# Altium footprint library User.PcbLib: 317 footprints (part 9 of 20)
Each footprint in its own frame and in the unit in brackets; x right, y up, seen from the top. Pads: shape width x height; smd on the part's side, far side on the other; paste and mask are expansions set on the pad; w line width, h text height; cw(c..) or ccw(c..) is an arc to the next point about the centre after c.
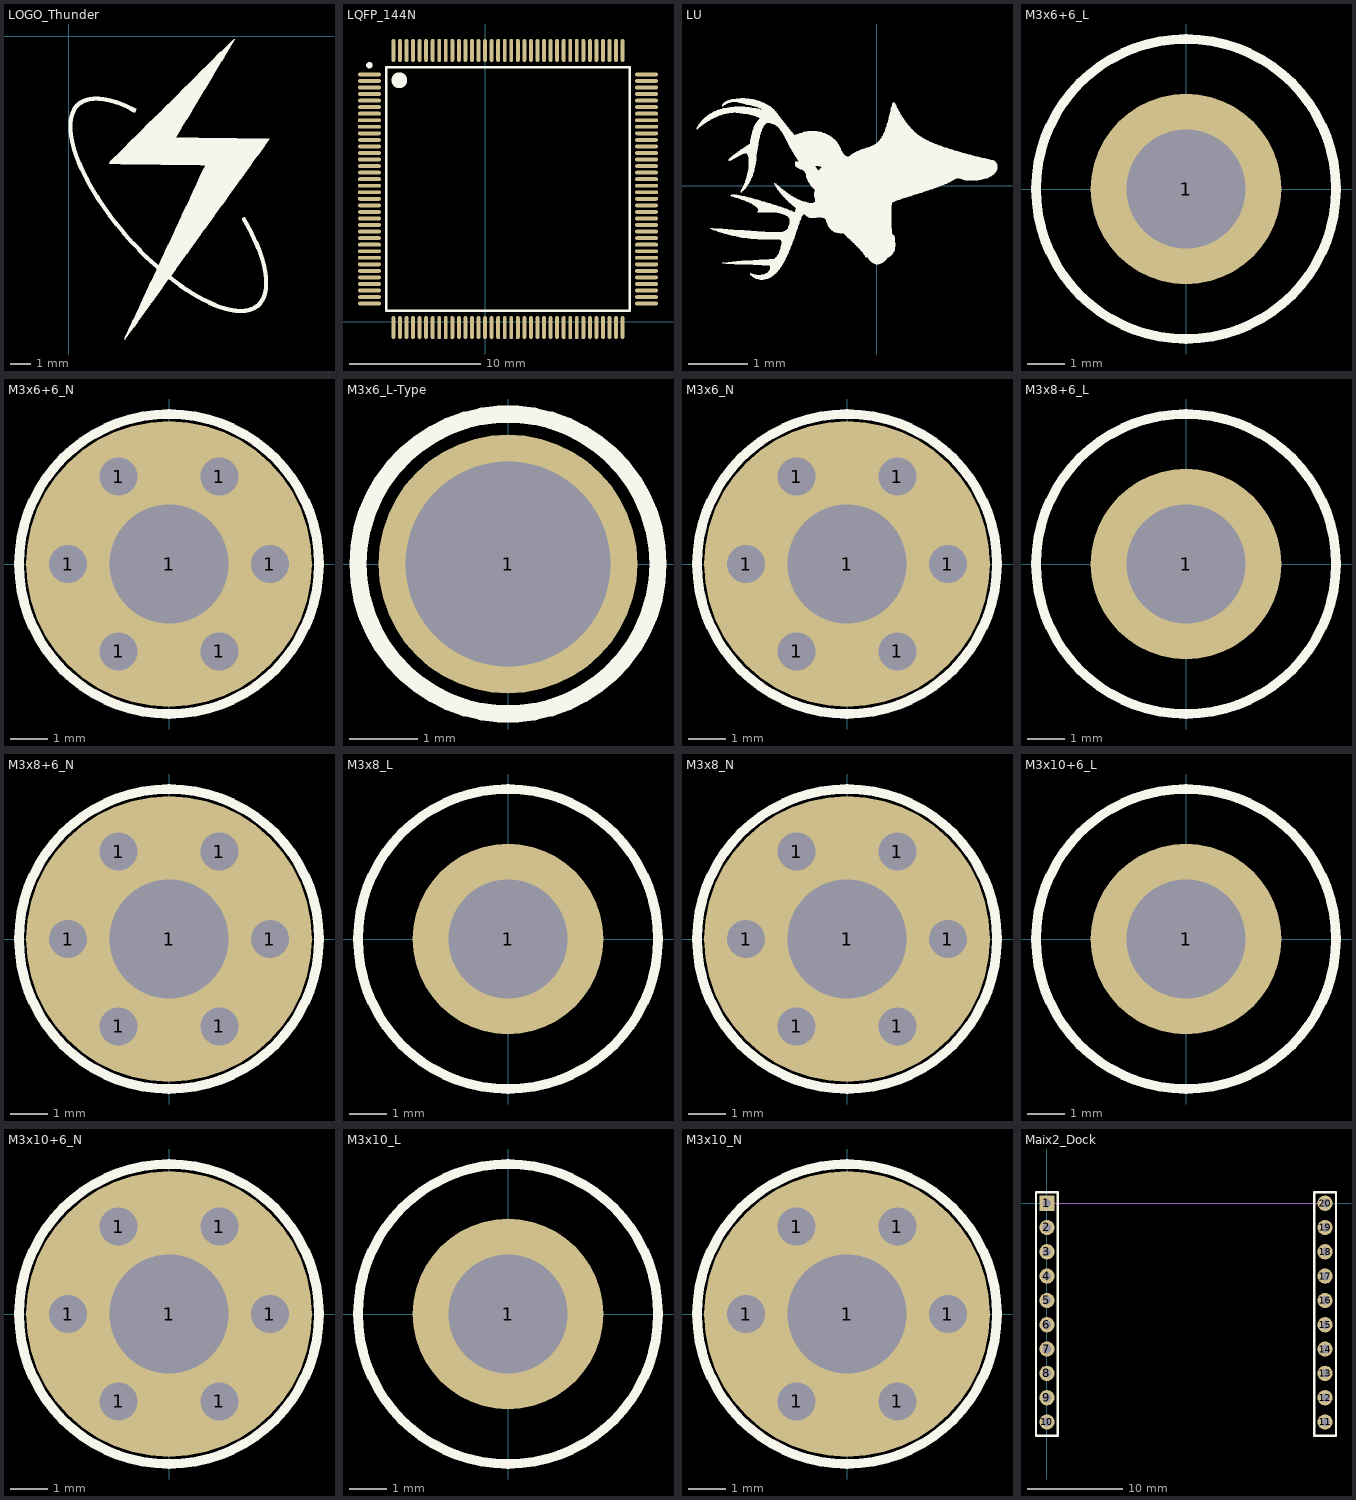
[diagram p8: the footprints below, top view; thin cyan lines are the x and y axes]

## LOGO_Thunder [mm]
Top Overlay:
  drawing of 2284 lines, arcs and shapes, not listed

## LQFP_144N [mm]
pads (144):
  oval 1.75x0.297 smd: 1(-8.82,18.868) 2(-8.82,18.368) 3(-8.82,17.868) 4(-8.82,17.368) 5(-8.82,16.868) 6(-8.82,16.368) 7(-8.82,15.868) 8(-8.82,15.368) 9(-8.82,14.868) 10(-8.82,14.368) 11(-8.82,13.868) 12(-8.82,13.368) 13(-8.82,12.868) 14(-8.82,12.368) 15(-8.82,11.868) 16(-8.82,11.368) 17(-8.82,10.868) 18(-8.82,10.368) 19(-8.82,9.868) 20(-8.82,9.368) 21(-8.82,8.868) 22(-8.82,8.368) 23(-8.82,7.868) 24(-8.82,7.368) 25(-8.82,6.868) 26(-8.82,6.368) 27(-8.82,5.868) 28(-8.82,5.368) 29(-8.82,4.868) 30(-8.82,4.368) 31(-8.82,3.868) 32(-8.82,3.368) 33(-8.82,2.868) 34(-8.82,2.368) 35(-8.82,1.868) 36(-8.82,1.368) 73(12.33,1.368) 74(12.33,1.868) 75(12.33,2.368) 76(12.33,2.868) 77(12.33,3.368) 78(12.33,3.868) 79(12.33,4.368) 80(12.33,4.868) 81(12.33,5.368) 82(12.33,5.868) 83(12.33,6.368) 84(12.33,6.868) 85(12.33,7.368) 86(12.33,7.868) 87(12.33,8.368) 88(12.33,8.868) 89(12.33,9.368) 90(12.33,9.868) 91(12.33,10.368) 92(12.33,10.868) 93(12.33,11.368) 94(12.33,11.868) 95(12.33,12.368) 96(12.33,12.868) 97(12.33,13.368) 98(12.33,13.868) 99(12.33,14.368) 100(12.33,14.868) 101(12.33,15.368) 102(12.33,15.868) 103(12.33,16.368) 104(12.33,16.868) 105(12.33,17.368) 106(12.33,17.868) 107(12.33,18.368) 108(12.33,18.868)
  oval 0.297x1.75 smd: 37(-6.995,-0.457) 38(-6.495,-0.457) 39(-5.995,-0.457) 40(-5.495,-0.457) 41(-4.995,-0.457) 42(-4.495,-0.457) 43(-3.995,-0.457) 44(-3.495,-0.457) 45(-2.995,-0.457) 46(-2.495,-0.457) 47(-1.995,-0.457) 48(-1.495,-0.457) 49(-0.995,-0.457) 50(-0.495,-0.457) 51(0.005,-0.457) 52(0.505,-0.457) 53(1.005,-0.457) 54(1.505,-0.457) 55(2.005,-0.457) 56(2.505,-0.457) 57(3.005,-0.457) 58(3.505,-0.457) 59(4.005,-0.457) 60(4.505,-0.457) 61(5.005,-0.457) 62(5.505,-0.457) 63(6.005,-0.457) 64(6.505,-0.457) 65(7.005,-0.457) 66(7.505,-0.457) 67(8.005,-0.457) 68(8.505,-0.457) 69(9.005,-0.457) 70(9.505,-0.457) 71(10.005,-0.457) 72(10.505,-0.457) 109(10.505,20.693) 110(10.005,20.693) 111(9.505,20.693) 112(9.005,20.693) 113(8.505,20.693) 114(8.005,20.693) 115(7.505,20.693) 116(7.005,20.693) 117(6.505,20.693) 118(6.005,20.693) 119(5.505,20.693) 120(5.005,20.693) 121(4.505,20.693) 122(4.005,20.693) 123(3.505,20.693) 124(3.005,20.693) 125(2.505,20.693) 126(2.005,20.693) 127(1.505,20.693) 128(1.005,20.693) 129(0.505,20.693) 130(0.005,20.693) 131(-0.495,20.693) 132(-0.995,20.693) 133(-1.495,20.693) 134(-1.995,20.693) 135(-2.495,20.693) 136(-2.995,20.693) 137(-3.495,20.693) 138(-3.995,20.693) 139(-4.495,20.693) 140(-4.995,20.693) 141(-5.495,20.693) 142(-5.995,20.693) 143(-6.495,20.693) 144(-6.995,20.693)
Top Overlay:
  circle w0.6: c-6.545,18.418 r0.3
  circle w0.25: c-8.82,19.568 r0.125
  lines w0.2: -7.545,0.818 11.055,0.818 11.055,19.418 -7.545,19.418 -7.545,0.818

## LU [mm]
Top Overlay:
  drawing of 1697 lines, arcs and shapes, not listed

## M3x6+6_L [mm] "M3铜柱，长：6mm，螺纹长：6mm"
pads (1):
  round 5.08 hole 3.175: 1(0,0)
Top Overlay:
  circle w0.254: c0,0 r4
3D body "M3x6+6.STEP": height 6.05, standoff -5.95, extent -2.698,-2.35 2.698,2.35

## M3x6+6_N [mil] "M3铜柱，长：6mm，螺纹长：6mm"
pads (7):
  round 40 hole 40: 1(-106,0) 1(-53,-91.8) 1(-53,91.8) 1(53,-91.8) 1(53,91.8) 1(106,0)
  round 300 hole 125: 1(0,0)
Top Overlay:
  circle w10: c0,0 r157.48
3D body "M3x6+6.STEP": height 238.2, standoff -234.25, extent -106.22,-92.52 106.22,92.52

## M3x6_L-Type [mm] "M3铜柱，长：6mm"
pads (1):
  round 3.8 hole 3: 1(0,0)
Top Overlay:
  circle w0.254: c0,0 r2.2
3D body "M3x8+6.STEP": height 8.55, standoff -5.45, extent -2.698,-2.35 2.698,2.35
3D body "M3x6.STEP": height 6.65, standoff 0.65, extent -2.698,-2.35 2.698,2.35

## M3x6_N [mil] "M3铜柱，长：6mm"
pads (7):
  round 40 hole 40: 1(-106,0) 1(-53,-91.8) 1(-53,91.8) 1(53,-91.8) 1(53,91.8) 1(106,0)
  round 300 hole 125: 1(0,0)
Top Overlay:
  circle w10: c0,0 r157.48
3D body "M3x6.STEP": height 238.19, standoff 1.96, extent -106.22,-92.52 106.22,92.52

## M3x8+6_L [mm] "M3铜柱，长：8mm，螺纹长：6mm"
pads (1):
  round 5.08 hole 3.175: 1(0,0)
Top Overlay:
  circle w0.254: c0,0 r4
3D body "M3x8+6.STEP": height 8.05, standoff -5.95, extent -2.698,-2.35 2.698,2.35

## M3x8+6_N [mil] "M3铜柱，长：8mm，螺纹长：6mm"
pads (7):
  round 40 hole 40: 1(-106,0) 1(-53,-91.8) 1(-53,91.8) 1(53,-91.8) 1(53,91.8) 1(106,0)
  round 300 hole 125: 1(0,0)
Top Overlay:
  circle w10: c0,0 r157.48
3D body "M3x8+6.STEP": height 316.94, standoff -234.25, extent -106.22,-92.52 106.22,92.52

## M3x8_L [mm] "M3铜柱，长：8mm"
pads (1):
  round 5.08 hole 3.175: 1(0,0)
Top Overlay:
  circle w0.254: c0,0 r4
3D body "M3x8.STEP": height 8.05, standoff 0.05, extent -2.698,-2.35 2.698,2.35

## M3x8_N [mil] "M3铜柱，长：8mm"
pads (7):
  round 40 hole 40: 1(-106,0) 1(-53,-91.8) 1(-53,91.8) 1(53,-91.8) 1(53,91.8) 1(106,0)
  round 300 hole 125: 1(0,0)
Top Overlay:
  circle w10: c0,0 r157.48
3D body "M3x8.STEP": height 316.93, standoff 1.96, extent -106.22,-92.52 106.22,92.52

## M3x10+6_L [mm] "M3铜柱，长：10mm，螺纹长：6mm"
pads (1):
  round 5.08 hole 3.175: 1(0,0)
Top Overlay:
  circle w0.254: c0,0 r4
3D body "M3x10+6.STEP": height 10.05, standoff -5.95, extent -2.698,-2.35 2.698,2.35

## M3x10+6_N [mil] "M3铜柱，长：10mm，螺纹长：6mm"
pads (7):
  round 40 hole 40: 1(-106,0) 1(-53,-91.8) 1(-53,91.8) 1(53,-91.8) 1(53,91.8) 1(106,0)
  round 300 hole 125: 1(0,0)
Top Overlay:
  circle w10: c0,0 r157.48
3D body "M3x10+6.STEP": height 395.67, standoff -234.25, extent -106.22,-92.52 106.22,92.52

## M3x10_L [mm] "M3铜柱，长：10mm"
pads (1):
  round 5.08 hole 3.175: 1(0,0)
Top Overlay:
  circle w0.254: c0,0 r4
3D body "M3x10.STEP": height 10.05, standoff 0.05, extent -2.698,-2.35 2.698,2.35

## M3x10_N [mil] "M3铜柱，长：10mm"
pads (7):
  round 40 hole 40: 1(-106,0) 1(-53,-91.8) 1(-53,91.8) 1(53,-91.8) 1(53,91.8) 1(106,0)
  round 300 hole 125: 1(0,0)
Top Overlay:
  circle w10: c0,0 r157.48
3D body "M3x10.STEP": height 395.67, standoff 1.96, extent -106.22,-92.52 106.22,92.52

## Maix2_Dock [mm]
pads (20):
  rect 1.6x1.6 hole 0.9: 1(0,0)
  round 1.6 hole 0.9: 2(0,-2.54) 3(0,-5.08) 4(0,-7.62) 5(0,-10.16) 6(0,-12.7) 7(0,-15.24) 8(0,-17.78) 9(0,-20.32) 10(0,-22.86) 11(29.06,-22.86) 12(29.06,-20.32) 13(29.06,-17.78) 14(29.06,-15.24) 15(29.06,-12.7) 16(29.06,-10.16) 17(29.06,-7.62) 18(29.06,-5.08) 19(29.06,-2.54) 20(29.06,0)
Top Overlay:
  lines w0.254: -1.143,-24.3 1.143,-24.3 1.143,1.143 -1.143,1.143 -1.143,-24.3 ; 27.917,-24.3 30.203,-24.3 30.203,1.143 27.917,1.143 27.917,-24.3
Mechanical 15:
  lines w0.127: 0,0 29.06,0
3D body "4.Maix-II-Dock-3072.step": height -3.5, standoff -41.5, extent -2.911,-32.858 31.819,14.508
3D body "HEADER 2.54X10.stp": height 8.3, standoff -2.9, extent -1.228,-24.257 1.27,1.143
3D body "HEADER 2.54X10.stp": height 8.3, standoff -2.9, extent 27.832,-24.257 30.33,1.143